# Altium schematic symbol library 13-Logic 数字 IC.SchLib: 324 symbols (part 8 of 30) (continued)
## EP3C55F484C8N (continued)
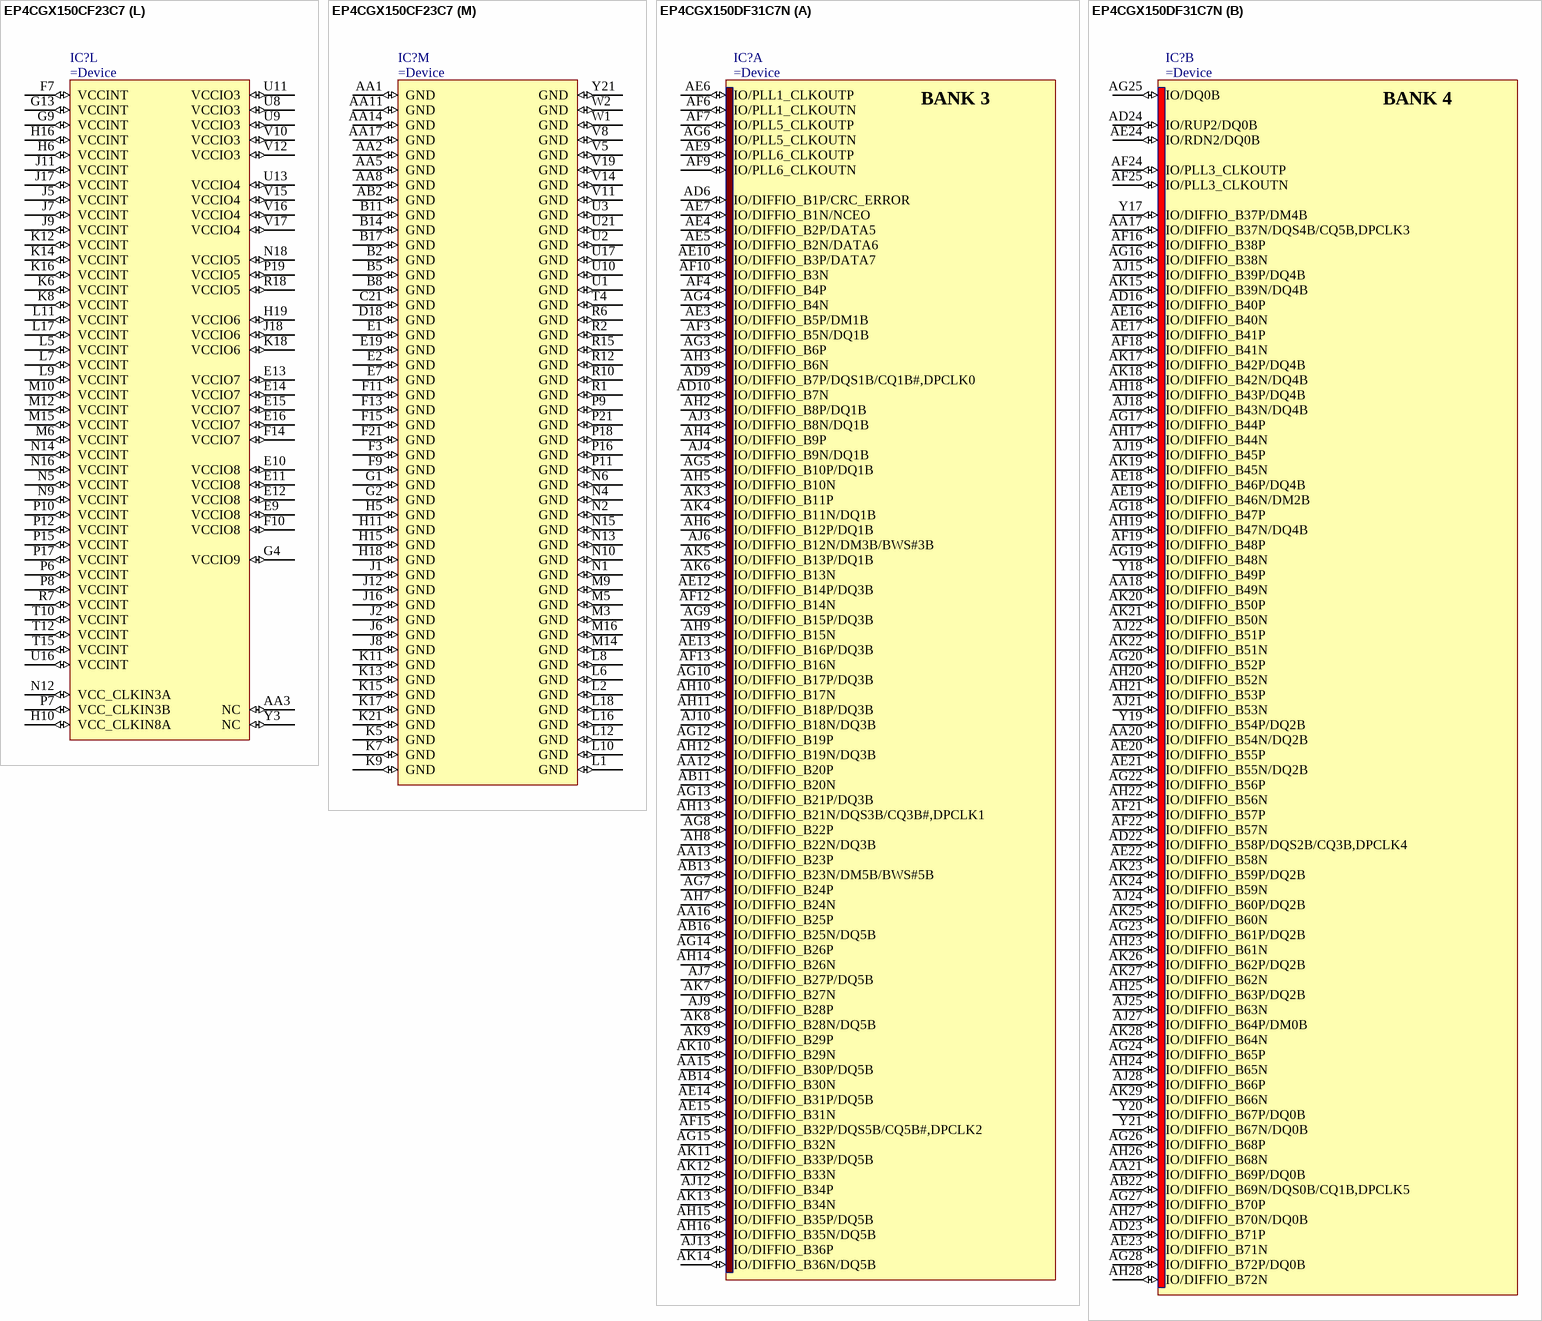
[diagram p50: symbols EP4CGX150CF23C7 to EP4CGX150DF31C7N]
part A text: BANK 1
part B text: BANK 2
part C text: BANK 3
part D text: BANK 4
part E text: BANK 5
part F text: BANK 6
part G text: BANK 7
part H text: BANK 8

## EP4CGX150CF23C7
designator IC?
Cyclone IV Family FPGA, 1.2V, 270 I/O Pins, 8 PLLs, 8 High-Speed Transceivers, 484-Pin FBGA, Speed Grade 7, Commercial Grade
part A pins: AA4 IO,DIFFIO_B1p (io), AA6 IO,DIFFIO_B17p,(DQ3B)/(DQ3B)/(DQ5B) (io), AA7 IO,DIFFIO_B19p (io), AA9 IO,DIFFIO_B22n,(DQ5B)/(DQ3B)/(DQ5B) (io), AA10 IO,DIFFIO_B32n,(DQ5B)/(DQ3B)/(DQ5B) (io), AB3 IO,DIFFIO_B1n (io), AB4 IO,DIFFIO_B13p,(DQ3B)/(DQ3B)/(DQ5B) (io), AB5 IO,DIFFIO_B13n,(DQ3B)/(DQ3B)/(DQ5B) (io), AB6 IO,DIFFIO_B17n,(DM5B/BWS#5B)/(DM3B/BWS#3B)/(DM5B/BWS#5B) (io), AB7 IO,DIFFIO_B19n (io), AB8 IO,DIFFIO_B23p,(DQ5B)/(DQ3B)/(DQ5B) (io), AB9 IO,DIFFIO_B23n (io), AB10 IO,DIFFIO_B36p,(DM4B)/(DM5B/BWS#5B)/(DM5B/BWS#5B) (io), AB11 IO,DIFFIO_B36n,(DQ5B)/(DQ5B) (io), R9 IO,DIFFIO_B3p,DATA7 (io), R11 IO,DIFFIO_B7p,(DQS1B/CQ1B#,DPCLK0)/(DQS1B/CQ1B#,DPCLK0)/(DQS1B/CQ1B#,DPCLK0) (io), T7 IO,PLL1_CLKOUTp (io), T8 IO,PLL1_CLKOUTn (io), T9 IO,DIFFIO_B3n (io), T11 IO,DIFFIO_B7n,(DQ3B)/(DQ3B)/(DQ5B) (io), U6 IO,PLL5_CLKOUTp (io), U7 IO,PLL6_CLKOUTp (io), V6 IO,PLL5_CLKOUTn (io), V7 IO,PLL6_CLKOUTn (io), W4 IO,DIFFIO_B2p,DATA5 (io), W5 IO,DIFFIO_B5p,(DM3B/BWS#3B)/(DM3B/BWS#3B)/(DM5B/BWS#5B) (io), W6 IO,DIFFIO_B8p,(DQ3B)/(DQ3B)/(DQ5B) (io), W7 IO,DIFFIO_B9p,(DQ3B)/(DQ3B)/(DQ5B) (io), W9 IO,DIFFIO_B21p,(DQ5B)/(DQ3B)/(DQ5B) (io), W11 IO,DIFFIO_B30p,(DQ5B)/(DQ3B)/(DQ5B) (io), W12 IO,DIFFIO_B35p,(DQ5B)/(DQ3B)/(DQ5B) (io), Y4 IO,DIFFIO_B2n,DATA6 (io), Y5 IO,DIFFIO_B5n,(DQ3B)/(DQ3B)/(DQ5B) (io), Y6 IO,DIFFIO_B8n,(DQ3B)/(DQ3B)/(DQ5B) (io), Y7 IO,DIFFIO_B9n,(DQ3B)/(DQ3B)/(DQ5B) (io), Y8 IO,DIFFIO_B21n,(DQS3B/CQ3B#,DPCLK1)/(DQS3B/CQ3B#,DPCLK1)/(DQS3B/CQ3B#,DPCLK1) (io), Y9 IO,DIFFIO_B22p,(DQ5B)/(DQ3B)/(DQ5B) (io), Y10 IO,DIFFIO_B32p,(DQS5B/CQ5B#,DPCLK2)/(DQS5B/CQ5B#,DPCLK2)/(DQS5B/CQ5B#,DPCLK2) (io), Y11 IO,DIFFIO_B30n,(DQ5B)/(DQ3B)/(DQ5B) (io), Y12 IO,DIFFIO_B35n,(DQ5B)/(DQ3B)/(DQ5B) (io)
part B pins: AA13 IO,DIFFIO_B41p (io), AA15 IO,DIFFIO_B58p,(DQS2B/CQ3B,DPCLK4)/(DQS2B/CQ3B,DPCLK4)/(DQS2B/CQ3B,DPCLK4) (io), AA16 IO,DIFFIO_B55n,(DQ2B)/(DQ5B)/(DQ5B) (io), AA18 IO,DIFFIO_B60n,(DQ2B)/(DQ5B)/(DQ5B) (io), AA19 IO,DIFFIO_B67p (io), AA20 IO,DIFFIO_B69p (io), AA21 IO,DIFFIO_B70p (io), AA22 IO,PLL3_CLKOUTp (io), AB13 IO,DIFFIO_B41n (io), AB14 IO,DIFFIO_B44p,(DQ4B)/(DQ5B)/(DQ5B) (io), AB15 IO,DIFFIO_B44n,(DQ4B)/(DQ5B)/(DQ5B) (io), AB16 IO,DIFFIO_B58n (io), AB17 IO,DIFFIO_B57p (io), AB18 IO,DIFFIO_B57n,(DQ2B)/(DQ5B)/(DQ5B) (io), AB19 IO,DIFFIO_B67n (io), AB20 IO,DIFFIO_B69n,(DQS0B/CQ1B,DPCLK5)/(DQS0B/CQ1B,DPCLK5)/(DQS0B/CQ1B,DPCLK5) (io), AB21 IO,DIFFIO_B70n,(DQ5B)/(DQ5B) (io), AB22 IO,PLL3_CLKOUTn (io), R13 IO,DIFFIO_B37p,(DQ4B)/(DQ5B)/(DQ5B) (io), R14 IO,DIFFIO_B46p (io), T13 IO,DIFFIO_B37n,(DQS4B/CQ5B,DPCLK3)/(DQS4B/CQ5B,DPCLK3)/(DQS4B/CQ5B,DPCLK3) (io), T14 IO,DIFFIO_B46n (io), U14 IO,DIFFIO_B54p (io), U15 IO,DIFFIO_B54n,(DQ2B)/(DQ5B)/(DQ5B) (io), W13 IO,DIFFIO_B39p,(DQ4B)/(DQ5B)/(DQ5B) (io), W14 IO,DIFFIO_B45p,(DQ4B)/(DQ5B)/(DQ5B) (io), W15 IO,DIFFIO_B52p,(DQ4B)/(DQ5B)/(DQ5B) (io), W17 IO,DIFFIO_B59p,(DQ2B)/(DQ5B)/(DQ5B) (io), W18 IO,DIFFIO_B72p (io), W19 IO,RUP2 (io), Y13 IO,DIFFIO_B39n,(DQ4B)/(DQ5B)/(DQ5B) (io), Y14 IO,DIFFIO_B45n,(DQ4B)/(DQ5B)/(DQ5B) (io), Y15 IO,DIFFIO_B52n,(DM2B)/(DM5B/BWS#5B)/(DM5B/BWS#5B) (io), Y16 IO,DIFFIO_B55p,(DQ2B)/(DQ5B)/(DQ5B) (io), Y17 IO,DIFFIO_B59n (io), Y18 IO,DIFFIO_B60p,(DQ2B)/(DQ5B)/(DQ5B) (io), Y19 IO,DIFFIO_B72n,(DQ2B)/(DQ5B)/(DQ5B) (io), Y20 IO,RDN2 (io)
part C pins: L13 IO,DIFFIO_R39n (io), L14 IO,DIFFIO_R43p (io), L15 IO,DIFFIO_R43n,(DQ1R)/(DQ3R)/(DQ1R) (io), M13 IO,DIFFIO_R39p,(DQ1R)/(DQ3R)/(DQ1R) (io), M17 IO,DIFFIO_R40n (io), M18 IO,DIFFIO_R34p,(DQ1R)/(DQ3R)/(DQ1R) (io), M19 IO,DIFFIO_R34n,(DQ1R)/(DQ3R)/(DQ1R) (io), N17 IO,DIFFIO_R40p,(DQ1R)/(DQ3R)/(DQ1R) (io), N19 IO,DIFFIO_R38p,(DQS1R/CQ1R#,DPCLK8)/(DQS1R/CQ1R#,DPCLK8)/(DQS1R/CQ1R#,DPCLK8) (io), N20 IO,DIFFIO_R38n (io), N21 IO,DIFFIO_R36p,(DQ1R)/(DQ3R)/(DQ1R) (io), N22 IO,DIFFIO_R36n,(DQ1R)/(DQ3R)/(DQ1R) (io), P13 IO,DIFFIO_R55p,DEV_CLRn (io), P14 IO,DIFFIO_R55n,DEV_OE (io), P22 IO,DIFFIO_R41n,(DQ1R)/(DQ3R)/(DQ1R (io), R16 IO,DIFFIO_R61p,(DQS5R/CQ5R#,DPCLK6)/(DQS5R/CQ5R#,DPCLK6)/(DQS5R/CQ5R#,DPCLK6) (io), R17 IO,DIFFIO_R61n,(DM3R/BWS#3R)/(DM3R/BWS#3R)/(DM1R/BWS#1R) (io), R19 IO,DIFFIO_R51p,(DQ3R)/(DQ3R)/(DQ1R (io), R20 IO,DIFFIO_R48p,(DM1R/BWS#1R)/(DM3R/BWS#3R)/(DM1R/BWS#1R) (io), R21 IO,DIFFIO_R48n (io), R22 IO,DIFFIO_R41p (io), T17 IO,RUP3 (io), T18 IO,RDN3 (io), T19 IO,DIFFIO_R52p (io), T20 IO,DIFFIO_R51n,(DQ3R)/(DQ3R)/(DQ1R) (io), T21 IO,DIFFIO_R46p,(DQ1R)/(DQ3R)/(DQ1R) (io), T22 IO,DIFFIO_R46n (io), U20 IO,DIFFIO_R52n,(DQ3R)/(DQ3R)/(DQ1R) (io), U22 IO,DIFFIO_R50n (io), V20 IO,DIFFIO_R54p,(DQ3R)/(DQ3R)/(DQ1R) (io), V21 IO,DIFFIO_R54n,(DQ3R)/(DQ3R)/(DQ1R) (io), V22 IO,DIFFIO_R50p,(DQS3R/CQ3R#,DPCLK7)/(DQS3R/CQ3R#,DPCLK7)/(DQS3R/CQ3R#,DPCLK7) (io), W20 IO,DIFFIO_R57p,(DQ3R)/(DQ3R)/(DQ1R) (io), W21 IO,DIFFIO_R57n,(DQ3R)/(DQ3R)/(DQ1R) (io), W22 IO,DIFFIO_R60n,(DQ3R)/(DQ3R)/(DQ1R) (io), Y22 IO,DIFFIO_R60p,(DQ3R)/(DQ3R)/(DQ1R) (io)
part D pins: A20 IO,DIFFIO_R12n (io), A21 IO,DIFFIO_R14p,(DQ2R)/(DQ1R)/(DQ1R) (io), A22 IO,DIFFIO_R14n (io), B19 IO,DIFFIO_R12p,(DQ2R)/(DQ1R)/(DQ1R) (io), B20 IO,DIFFIO_R10p,(DQ2R)/(DQ1R)/(DQ1R,(DQ2R)/(DQ1R)/(DQ1R) (io), B21 IO,DIFFIO_R10n,(DQS2R/CQ3R,DPCLK10)/(DQS2R/CQ3R,DPCLK10)/(DQS2R/CQ3R,DPCLK10) (io), B22 IO,DIFFIO_R15n (io), C19 IO,DIFFIO_R11p,(DQ2R)/(DQ1R)/(DQ1R) (io), C20 IO,DIFFIO_R11n (io), C22 IO,DIFFIO_R15p,(DQ1R)/(DQ1R) (io), D19 IO,DIFFIO_R13p,(DQ2R)/(DQ1R)/(DQ1R) (io), D20 IO,DIFFIO_R13n (io), D21 IO,DIFFIO_R16p,(DM2R)/(DM1R/BWS#1R)/(DM1R/BWS#1R) (io), D22 IO,DIFFIO_R16n (io), E20 IO,DIFFIO_R20n (io), E21 IO,DIFFIO_R17p,(DQ1R)/(DQ1R) (io), E22 IO,DIFFIO_R17n (io), F18 IO,DIFFIO_R1p,(DQ2R)/(DQ1R)/(DQ1R) (io), F20 IO,DIFFIO_R20p (io), F22 IO,DIFFIO_R19n,(DQ0R)/(DQ1R)/(DQ1R) (io), G16 IO,DIFFIO_R2p,(DQS4R/CQ5R,DPCLK11)/(DQS4R/CQ5R,DPCLK11)/(DQS4R/CQ5R,DPCLK11) (io), G17 IO,DIFFIO_R2n,(DQ2R)/(DQ1R)/(DQ1R) (io), G19 IO,DIFFIO_R1n,(DQ2R)/(DQ1R)/(DQ1R) (io), G20 IO,DIFFIO_R22p,(DQ0R)/(DQ1R)/(DQ1R) (io), G21 IO,DIFFIO_R22n (io), G22 IO,DIFFIO_R19p (io), H20 IO,DIFFIO_R23p,(DQ0R)/(DQ1R)/(DQ1R) (io), H21 IO,DIFFIO_R23n (io), H22 IO,DIFFIO_R29n,(DQS0R/CQ1R,DPCLK9)/(DQS0R/CQ1R,DPCLK9)/(DQS0R/CQ1R,DPCLK9) (io), J19 IO,DIFFIO_R31p,(DQ0R)/(DQ1R)/(DQ1R) (io), J20 IO,DIFFIO_R31n,(DQ0R)/(DQ1R)/(DQ1R) (io), J21 IO,DIFFIO_R29p (io), J22 IO,DIFFIO_R26n (io), K19 IO,DIFFIO_R25p,(DQ0R)/(DQ1R)/(DQ1R) (io), K20 IO,DIFFIO_R25n (io), K22 IO,DIFFIO_R26p,(DQ0R)/(DQ1R)/(DQ1R) (io), L19 IO,DIFFIO_R32p,(DQ0R)/(DQ1R)/(DQ1R) (io), L20 IO,DIFFIO_R32n,(DM0R)/(DM1R/BWS#1R)/(DM1R/BWS#1R) (io)
part E pins: A10 IO,DIFFIO_T37n,(DQ4T)/(DQ5T)/(DQ5T) (io), A11 IO,DIFFIO_T40n,(DQ4T)/(DQ5T)/(DQ5T) (io), A12 IO,DIFFIO_T40p (io), A13 IO,DIFFIO_T52n (io), A14 IO,DIFFIO_T52p (io), A15 IO,DIFFIO_T56n,(DQ2T)/(DQ5T)/(DQ5T) (io), A16 IO,DIFFIO_T63n,(DQ2T)/(DQ5T)/(DQ5T) (io), A17 IO,DIFFIO_T63p (io), A18 IO,DIFFIO_T69n,(DQ2T)/(DQ5T)/(DQ5T) (io), A19 IO,DIFFIO_T69p,(DQ2T)/(DQ5T)/(DQ5T) (io), B10 IO,DIFFIO_T37p,(DQS4T/CQ5T,DPCLK14)/(DQS4T/CQ5T,DPCLK14)/(DQS4T/CQ5T,DPCLK14) (io), B12 IO,DIFFIO_T49n,(DQ4T)/(DQ5T)/(DQ5T) (io), B13 IO,DIFFIO_T49p,(DQ4T)/(DQ5T)/(DQ5T) (io), B15 IO,DIFFIO_T56p,(DQ2T)/(DQ5T)/(DQ5T) (io), B16 IO,DIFFIO_T65n,(DQS0T/CQ1T,DPCLK12)/(DQS0T/CQ1T,DPCLK12)/(DQS0T/CQ1T,DPCLK12) (io), B18 IO (io), C10 IO,DIFFIO_T42n,(DQ4T)/(DQ5T)/(DQ5T) (io), C11 IO,DIFFIO_T42p (io), C12 IO,DIFFIO_T51n,(DM2T)/(DM5T/BWS#5T)/(DM5T/BWS#5T) (io), C13 IO,DIFFIO_T51p (io), C14 IO,DIFFIO_T55n (io), C15 IO,DIFFIO_T61n,(DQ2T)/(DQ5T)/(DQ5T) (io), C16 IO,DIFFIO_T65p,(DQ2T)/(DQ5T)/(DQ5T) (io), C17 IO,PLL4_CLKOUTn (io), C18 IO,PLL4_CLKOUTp (io), D14 IO,DIFFIO_T55p,(DQ2T)/(DQ5T)/(DQ5T) (io), D15 IO,DIFFIO_T61p (io), D17 IO,DIFFIO_T67n (io), E17 IO,DIFFIO_T67p (io), F16 IO,RUP4 (io), F17 IO,RDN4 (io), G12 IO,DIFFIO_T36n,(DQ5T)/(DQ5T) (io), G14 IO,DIFFIO_T47n (io), G15 IO,DIFFIO_T47p,(DQS2T/CQ3T,DPCLK13)/(DQS2T/CQ3T,DPCLK13)/(DQS2T/CQ3T,DPCLK13) (io), H12 IO,DIFFIO_T36p,(DM4T)/(DM5T/BWS#5T)/(DM5T/BWS#5T) (io), H13 IO,DIFFIO_T41n,(DQ4T)/(DQ5T)/(DQ5T) (io), H14 IO,DIFFIO_T45n (io), J13 IO,DIFFIO_T41p,(DQ4T)/(DQ5T)/(DQ5T) (io), J14 IO,DIFFIO_T45p,(DQ4T)/(DQ5T)/(DQ5T) (io)
part F pins: A1 IO,DIFFIO_T20n (io), A2 IO,DIFFIO_T26n,(DQ5T)/(DQ3T)/(DQ5T) (io), A3 IO,DIFFIO_T26p,(DQ5T)/(DQ3T)/(DQ5T) (io), A4 IO,DIFFIO_T28n,(DQ5T)/(DQ3T)/(DQ5T) (io), A5 IO,DIFFIO_T28p (io), A6 IO,DIFFIO_T31n (io), A7 IO,DIFFIO_T31p,(DQ5T)/(DQ3T)/(DQ5T) (io), A8 IO,DIFFIO_T34n,(DQS5T/CQ5T#,DPCLK15)/(DQS5T/CQ5T#,DPCLK15)/(DQS5T/CQ5T#,DPCLK15) (io), B1 IO,DIFFIO_T20p,(DQ5T)/(DQ3T)/(DQ5T) (io), B3 IO,DIFFIO_T24n,(DQ5T)/(DQ3T)/(DQ5T) (io), B4 IO,DIFFIO_T24p (io), B6 IO,DIFFIO_T23n,(DQ5T)/(DQ3T)/(DQ5T) (io), B7 IO,DIFFIO_T34p,(DQ5T)/(DQ3T)/(DQ5T) (io), C1 IO,DIFFIO_T17n,(DM5T/BWS#5T)/(DM3T/BWS#3T)/(DM5T/BWS#5T) (io), C2 IO,DIFFIO_T17p (io), C3 IO,DIFFIO_T14n (io), C4 IO,DIFFIO_T14p,(DQ3T)/(DQ3T)/(DQ5T) (io), C5 IO,DIFFIO_T10n,(DQ3T)/(DQ3T)/(DQ5T) (io), C6 IO,DIFFIO_T23p,(DQ5T)/(DQ3T)/(DQ5T) (io), C7 IO,DIFFIO_T15n,(DQS3T/CQ3T#,DPCLK16)/(DQS3T/CQ3T#,DPCLK16)/(DQS3T/CQ3T#,DPCLK16) (io), C8 IO,DIFFIO_T19n (io), C9 IO,DIFFIO_T8n,(DQ3T)/(DQ3T)/(DQ5T) (io), D4 IO,DIFFIO_T10p (io), D5 IO,DIFFIO_T9n,(DQ3T)/(DQ3T)/(DQ5T) (io), D6 IO,DIFFIO_T7n,(DQ3T)/(DQ3T)/(DQ5T) (io), D7 IO,DIFFIO_T15p,(DQ3T)/(DQ3T)/(DQ5T) (io), D8 IO,DIFFIO_T19p (io), D9 IO,DIFFIO_T8p,(DQ3T)/(DQ3T)/(DQ5T) (io), E5 IO,DIFFIO_T9p,(DQS1T/CQ1T#,DPCLK17)/(DQS1T/CQ1T#,DPCLK17)/(DQS1T/CQ1T#,DPCLK17) (io), E6 IO,DIFFIO_T7p,(DQ3T)/(DQ3T)/(DQ5T) (io), E8 IO,DIFFIO_T13n,(DQ3T)/(DQ3T)/(DQ5T) (io), F6 IO,DIFFIO_T4n,DATA4,(DM3T/BWS#3T)/(DM3T/BWS#3T)/(DM5T/BWS#5T) (io), F8 IO,DIFFIO_T13p (io), G6 IO,DIFFIO_T4p,DATA3 (io), G7 IO,DIFFIO_T6n (io), G8 IO,DIFFIO_T1n,DATA2 (io), G10 IO,PLL2_CLKOUTn (io), H7 IO,DIFFIO_T6p (io), H8 IO,DIFFIO_T1p (io), H9 IO,PLL2_CLKOUTp (io)
part G pins: A9 CLKIO8,DIFFCLK_5n (io), AA12 CLKIO14,DIFFCLK_6p (io), AB12 CLKIO15,DIFFCLK_6n (io), B9 CLKIO9,DIFFCLK_5p (io), J10 CLKIO10,DIFFCLK_4n,REFCLK3n (io), K10 CLKIO11,DIFFCLK_4p,REFCLK3p (io), L21 CLKIO7,DIFFCLK_3p (io), L22 CLKIO6,DIFFCLK_3n (io), M7 REFCLK0p,DIFFCLK_0p,CLKIO20 (io), M8 REFCLK1p,DIFFCLK_1p,CLKIO22 (io), M11 CLKIO12,DIFFCLK_7p,REFCLK2p (io), M21 CLKIO5,DIFFCLK_2p (io), M22 CLKIO4,DIFFCLK_2n (io), N7 REFCLK0n,DIFFCLK_0n (io), N8 REFCLK1n,DIFFCLK_1n (io), N11 CLKIO13,DIFFCLK_7n,REFCLK2n (io)
part H pins: F1 GXB_TX3n (io), F2 GXB_TX3p (io), H1 GXB_RX3n (io), H2 GXB_RX3p (io), K1 GXB_TX2n (io), K2 GXB_TX2p (io), M1 GXB_RX2n (io), M2 GXB_RX2p (io), P1 GXB_TX1n (io), P2 GXB_TX1p (io), T1 GXB_RX1n (io), T2 GXB_RX1p (io), V1 GXB_TX0n (io), V2 GXB_TX0p (io), Y1 GXB_RX0n (io), Y2 GXB_RX0p (io)
part I pins: D1 IO,DATA1,ASDO (io), D2 nCE (io), D3 DCLK (io), E3 TDO (io), E4 TCK (io), F5 TDI (io), G5 TMS (io), G11 IO,CLKUSR (io), H4 nCONFIG (io), J4 IO,NCSO (io), K4 IO,DATA0 (io), P4 MSEL3 (io), P5 MSEL1 (io), R5 MSEL2 (io), R8 nSTATUS (io), T6 MSEL0 (io), U5 CONF_DONE (io), W8 IO,INIT_DONE (io)
part J pins: D10 IO,VREFB8N2 (io), D11 IO,VREFB8N1 (io), D12 IO,VREFB8N0 (io), D13 IO,VREFB7N1 (io), D16 IO,VREFB7N0 (io), F12 IO,VREFB7N2 (io), G18 IO,VREFB6N0 (io), H17 IO,VREFB6N1 (io), J15 IO,VREFB6N2 (io), M20 IO,VREFB5N0 (io), P20 IO,VREFB5N1 (io), T16 IO,VREFB4N0 (io), U12 IO,VREFB3N0 (io), U18 IO,VREFB5N2 (io), V9 IO,VREFB3N2 (io), V13 IO,VREFB4N2 (io), W10 IO,VREFB3N1 (io), W16 IO,VREFB4N1 (io)
part K pins: AB1 RREF0 (io), E18 VCCD_PLL (io), F4 VCCA (io), F19 VCCA (io), G3 VCCD_PLL (io), H3 VCCH_GXB (io), J3 VCCA_GXB (io), K3 VCCL_GXB (io), L3 VCCL_GXB (io), L4 VCCA (io), M4 VCCD_PLL (io), N3 VCCL_GXB (io), P3 VCCH_GXB (io), R3 VCCA_GXB (io), R4 VCCD_PLL (io), T3 VCCL_GXB (io), T5 VCCA (io), U4 VCCD_PLL (io), U19 VCCA (io), V3 VCCL_GXB (io), V4 VCCA (io), V18 VCCD_PLL (io), W3 VCCA_GXB (io)
part L pins: AA3 NC (io), E9 VCCIO8 (io), E10 VCCIO8 (io), E11 VCCIO8 (io), E12 VCCIO8 (io), E13 VCCIO7 (io), E14 VCCIO7 (io), E15 VCCIO7 (io), E16 VCCIO7 (io), F7 VCCINT (io), F10 VCCIO8 (io), F14 VCCIO7 (io), G4 VCCIO9 (io), G9 VCCINT (io), G13 VCCINT (io), H6 VCCINT (io), H10 VCC_CLKIN8A (io), H16 VCCINT (io), H19 VCCIO6 (io), J5 VCCINT (io), J7 VCCINT (io), J9 VCCINT (io), J11 VCCINT (io), J17 VCCINT (io), J18 VCCIO6 (io), K6 VCCINT (io), K8 VCCINT (io), K12 VCCINT (io), K14 VCCINT (io), K16 VCCINT (io), K18 VCCIO6 (io), L5 VCCINT (io), L7 VCCINT (io), L9 VCCINT (io), L11 VCCINT (io), L17 VCCINT (io), M6 VCCINT (io), M10 VCCINT (io), M12 VCCINT (io), M15 VCCINT (io), N5 VCCINT (io), N9 VCCINT (io), N12 VCC_CLKIN3A (io), N14 VCCINT (io), N16 VCCINT (io), N18 VCCIO5 (io), P6 VCCINT (io), P7 VCC_CLKIN3B (io), P8 VCCINT (io), P10 VCCINT (io), P12 VCCINT (io), P15 VCCINT (io), P17 VCCINT (io), P19 VCCIO5 (io), R7 VCCINT (io), R18 VCCIO5 (io), T10 VCCINT (io), T12 VCCINT (io), T15 VCCINT (io), U8 VCCIO3 (io), U9 VCCIO3 (io), U11 VCCIO3 (io), U13 VCCIO4 (io), U16 VCCINT (io), V10 VCCIO3 (io), V12 VCCIO3 (io), V15 VCCIO4 (io), V16 VCCIO4 (io), V17 VCCIO4 (io), Y3 NC (io)
part M pins: AA1 GND (io), AA2 GND (io), AA5 GND (io), AA8 GND (io), AA11 GND (io), AA14 GND (io), AA17 GND (io), AB2 GND (io), B2 GND (io), B5 GND (io), B8 GND (io), B11 GND (io), B14 GND (io), B17 GND (io), C21 GND (io), D18 GND (io), E1 GND (io), E2 GND (io), E7 GND (io), E19 GND (io), F3 GND (io), F9 GND (io), F11 GND (io), F13 GND (io), F15 GND (io), F21 GND (io), G1 GND (io), G2 GND (io), H5 GND (io), H11 GND (io), H15 GND (io), H18 GND (io), J1 GND (io), J2 GND (io), J6 GND (io), J8 GND (io), J12 GND (io), J16 GND (io), K5 GND (io), K7 GND (io), K9 GND (io), K11 GND (io), K13 GND (io), K15 GND (io), K17 GND (io), K21 GND (io), L1 GND (io), L2 GND (io), L6 GND (io), L8 GND (io), L10 GND (io), L12 GND (io), L16 GND (io), L18 GND (io), M3 GND (io), M5 GND (io), M9 GND (io), M14 GND (io), M16 GND (io), N1 GND (io), N2 GND (io), N4 GND (io), N6 GND (io), N10 GND (io), N13 GND (io), N15 GND (io), P9 GND (io), P11 GND (io), P16 GND (io), P18 GND (io), P21 GND (io), R1 GND (io), R2 GND (io), R6 GND (io), R10 GND (io), R12 GND (io), R15 GND (io), T4 GND (io), U1 GND (io), U2 GND (io), U3 GND (io), U10 GND (io), U17 GND (io), U21 GND (io), V5 GND (io), V8 GND (io), V11 GND (io), V14 GND (io), V19 GND (io), W1 GND (io), W2 GND (io), Y21 GND (io)
part A text: BANK 3
part B text: BANK 4
part C text: BANK 5
part D text: BANK 6
part E text: BANK 7
part F text: BANK 8

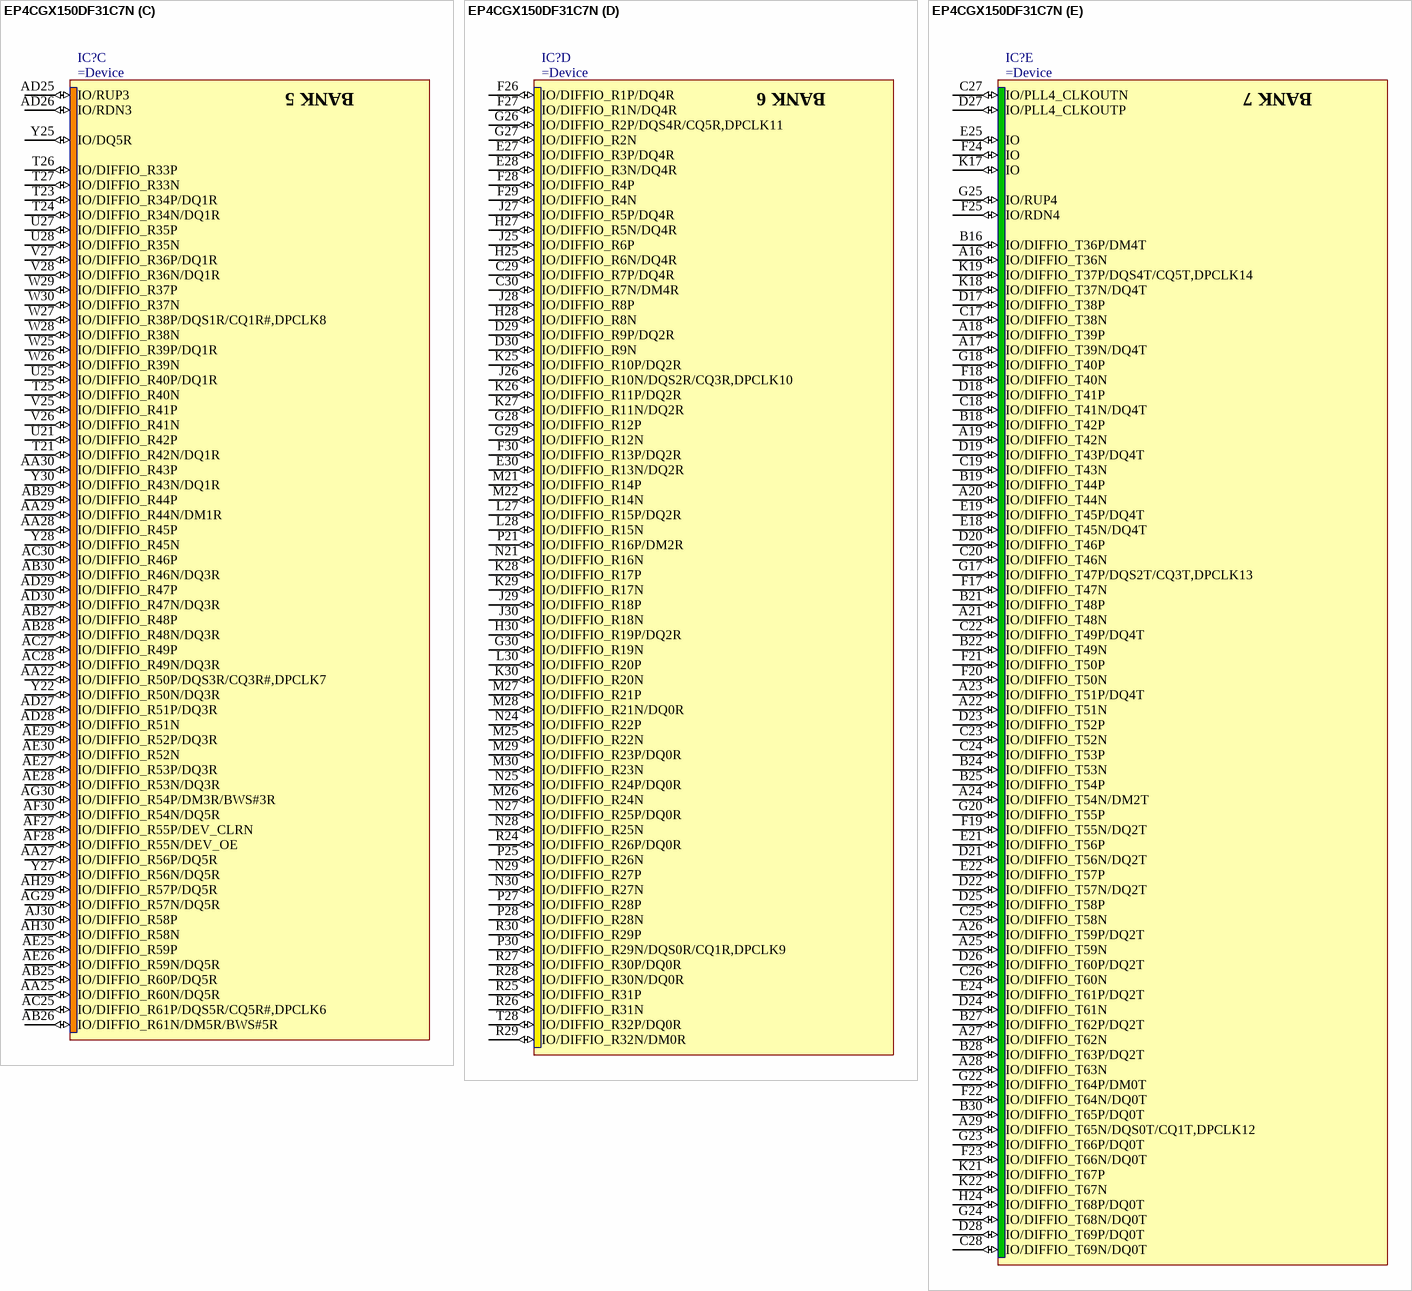
[diagram p51: symbol EP4CGX150DF31C7N]

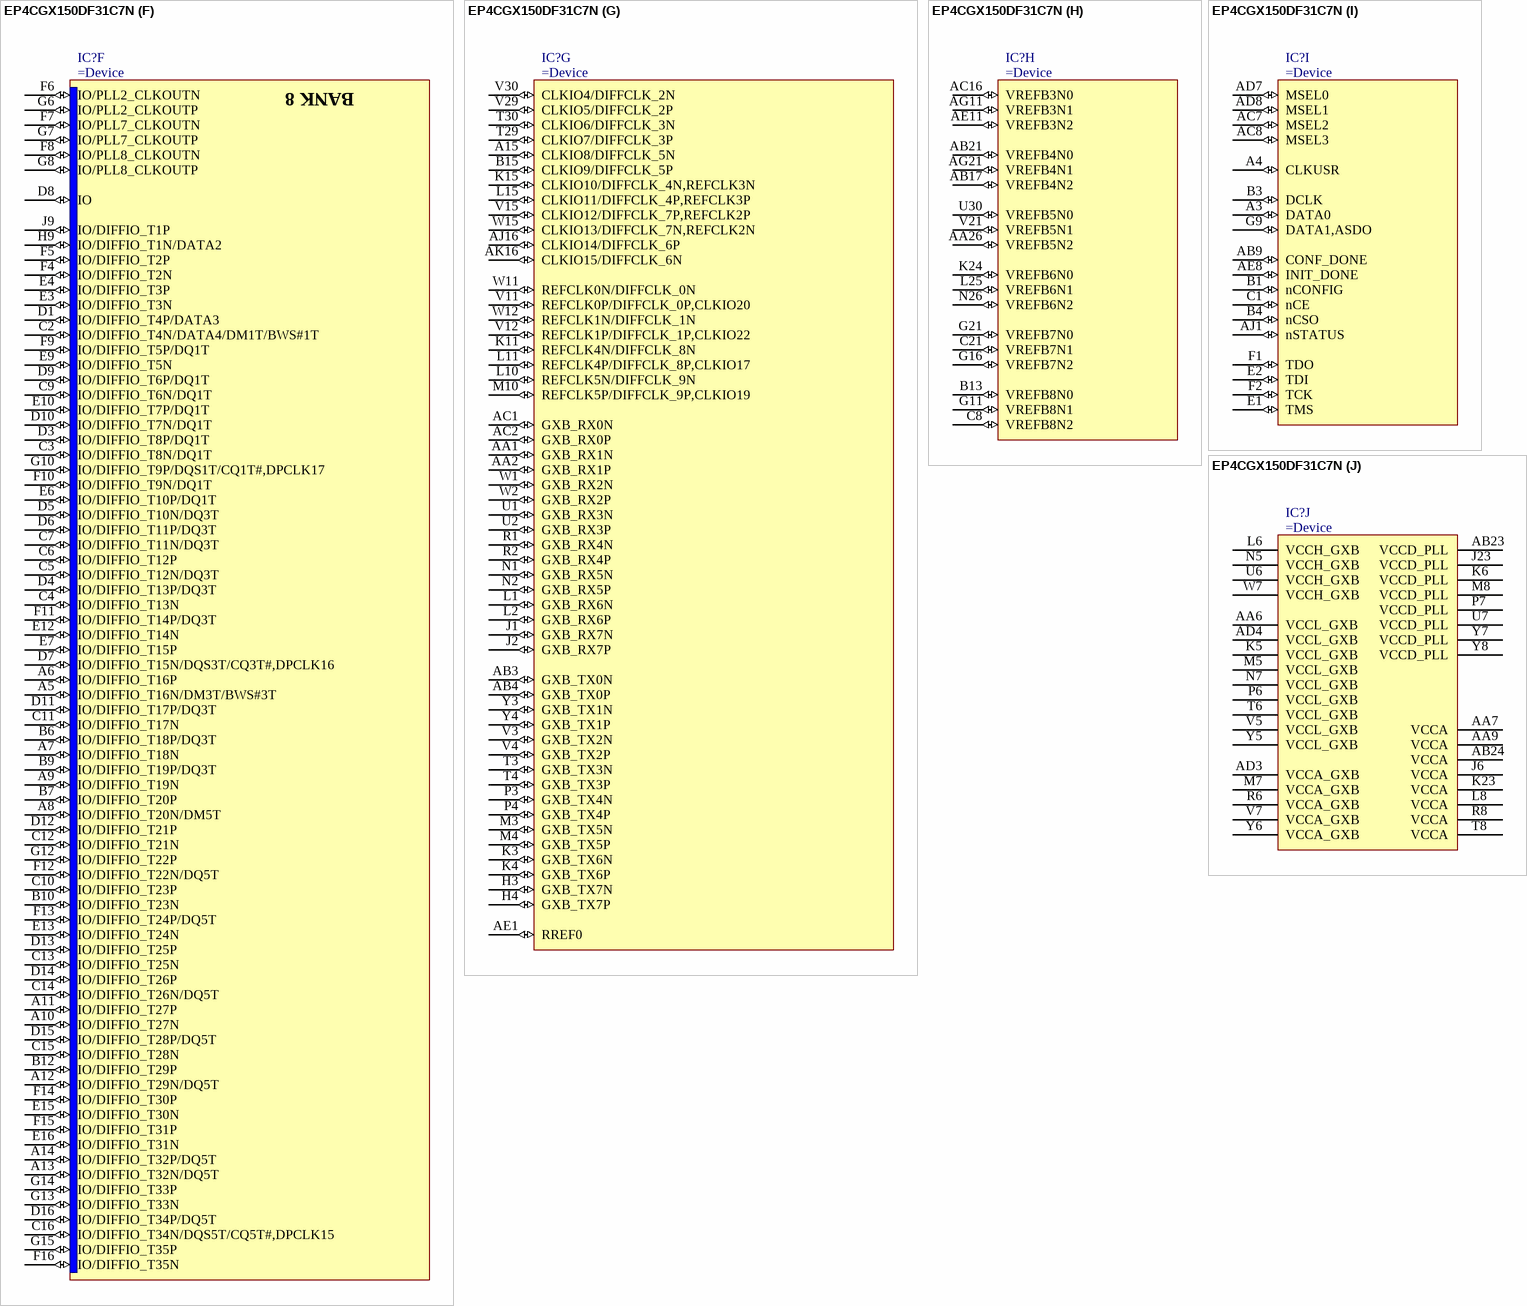
[diagram p52: symbol EP4CGX150DF31C7N]

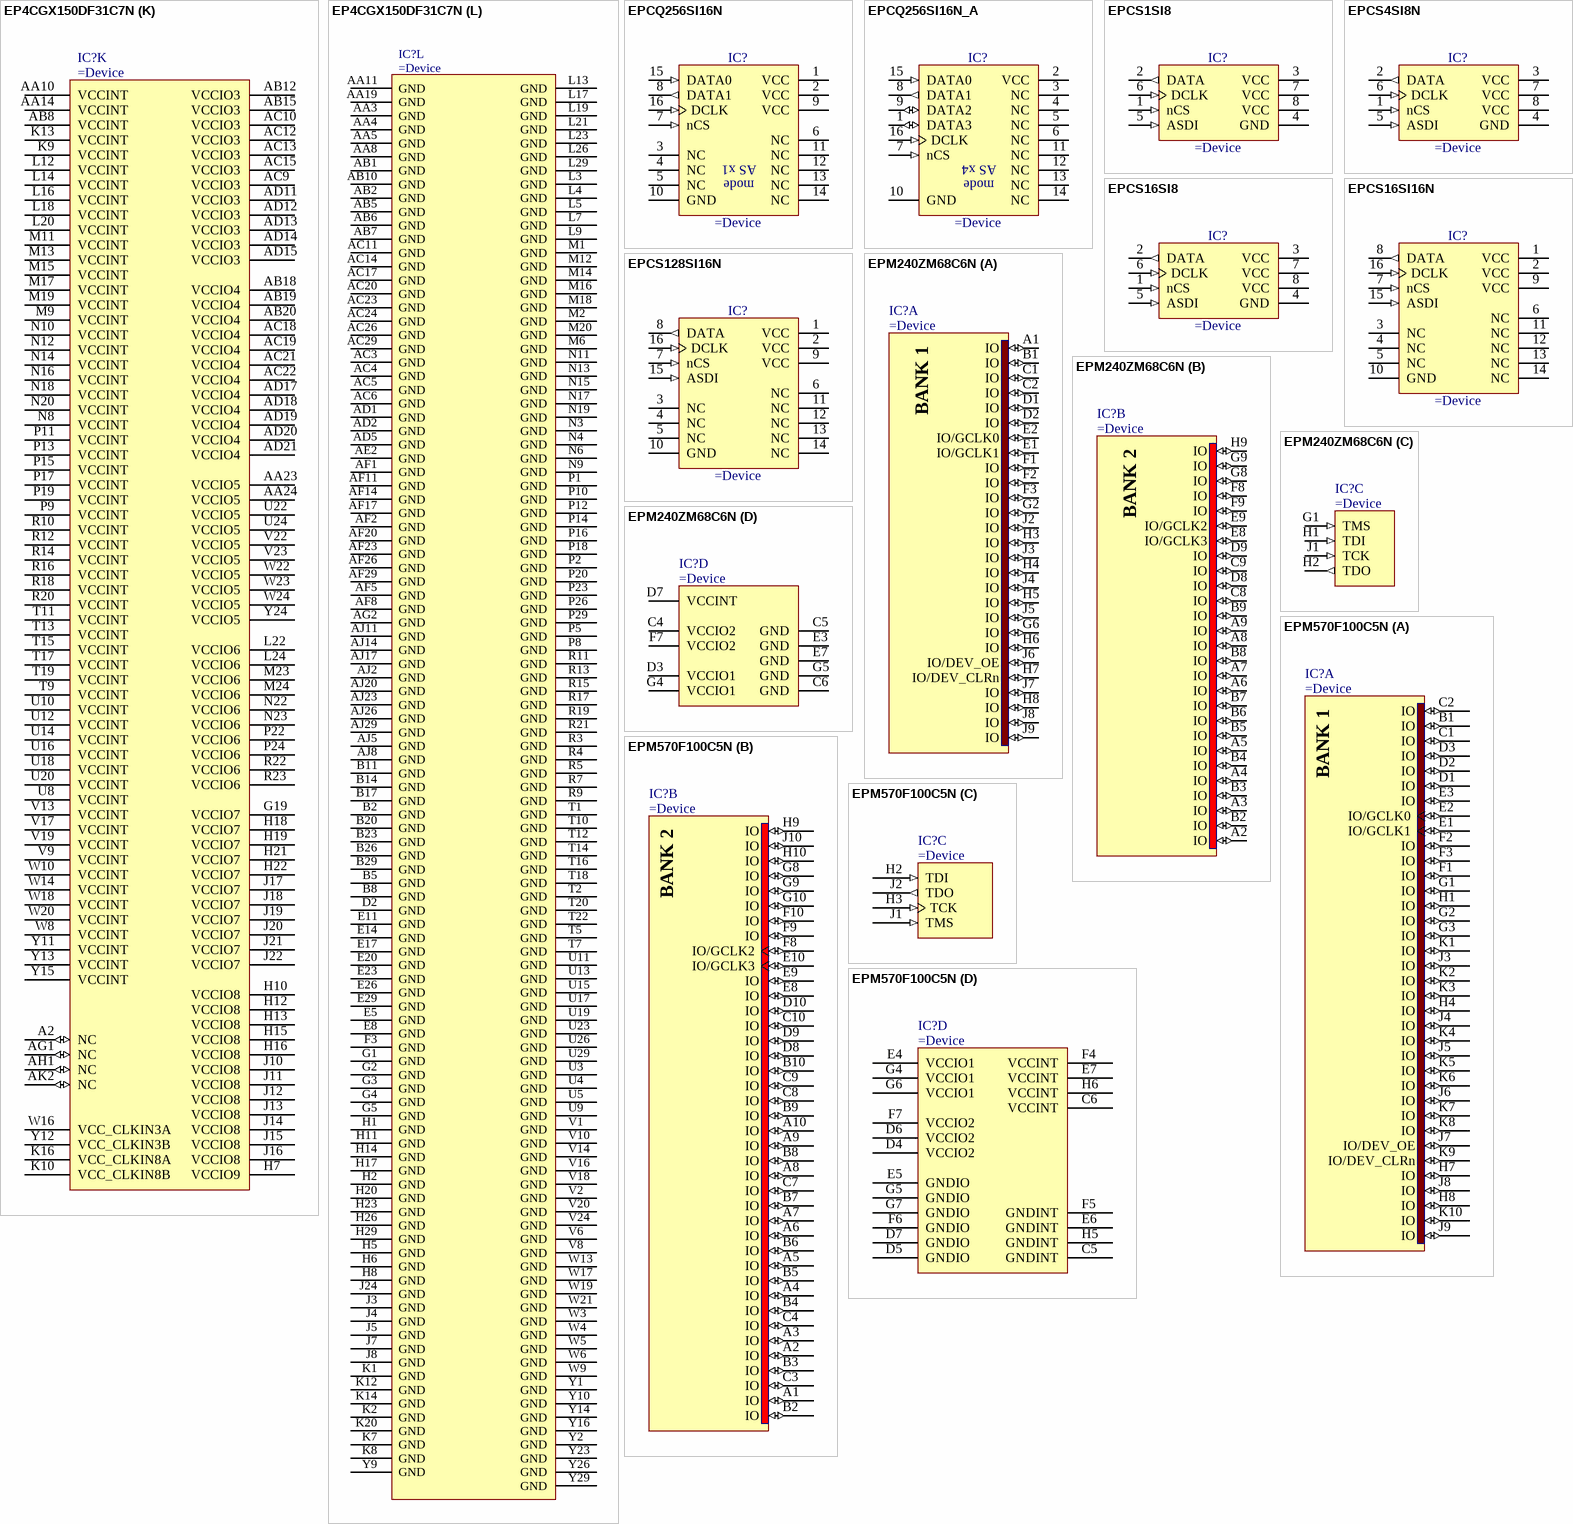
[diagram p53: symbols EP4CGX150DF31C7N to EPM570F100C5N]